# Altium footprint library 1.08-LED发光二极管.PcbLib: 72 footprints (part 4 of 5)
Each footprint in its own frame and in the unit in brackets; x right, y up, seen from the top. Pads: shape width x height; smd on the part's side, far side on the other; paste and mask are expansions set on the pad; w line width, h text height; cw(c..) or ccw(c..) is an arc to the next point about the centre after c.
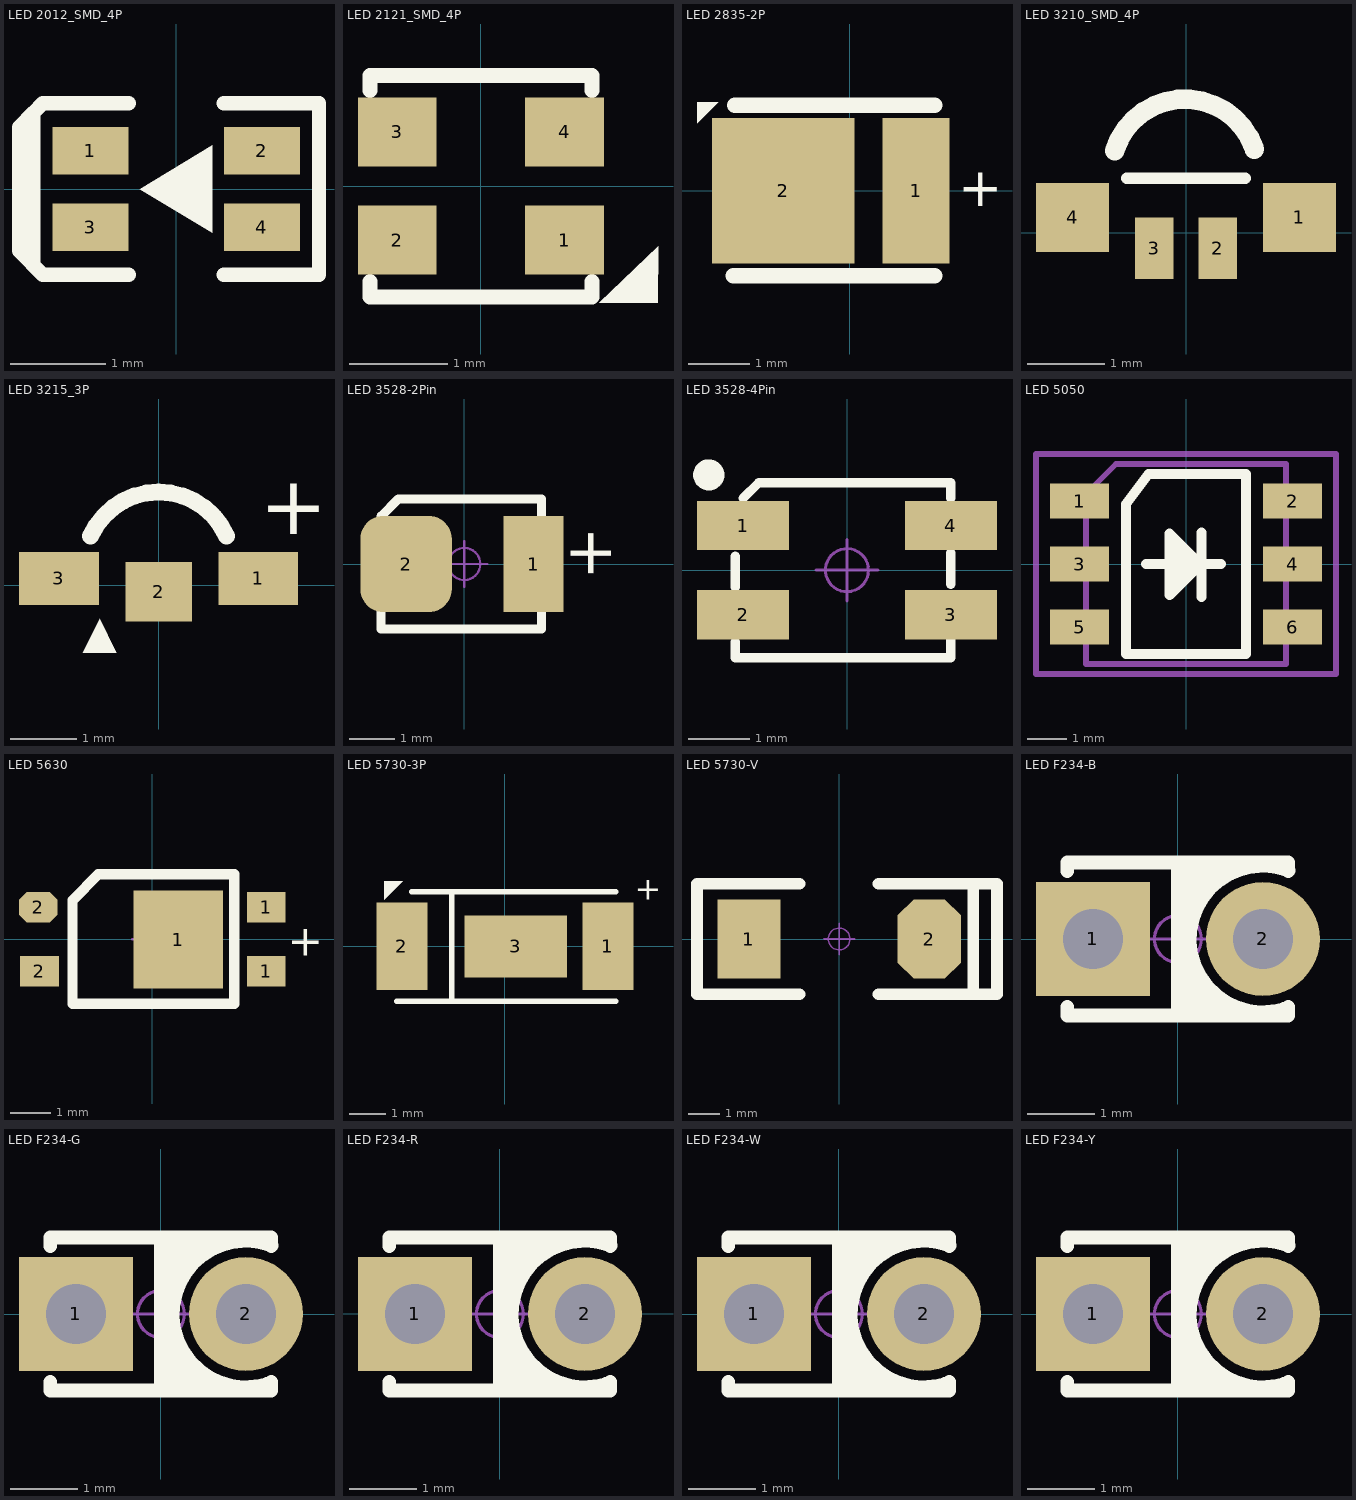
[diagram p3: the footprints below, top view; thin cyan lines are the x and y axes]

## LED 2012_SMD_4P [mm] "封装来自淘宝卖家ID:黄晶宝石"
pads (4):
  rect 0.8x0.5 smd: 1(-0.9,0.4) 2(0.9,0.4) 3(-0.9,-0.4) 4(0.9,-0.4)
Top Overlay:
  region: 0.381,0.457 0.381,-0.457 -0.381,0
  lines w0.152: -0.5,-0.9 -1.4,-0.899 ; -0.5,0.9 -1.4,0.899 -1.499,0.8 ; 0.5,-0.899 1.501,-0.899 1.501,0.899 0.5,0.899 ; -1.499,0.8 -1.5,0.8 -1.651,0.649 -1.651,-0.648 -1.4,-0.899 ; -1.499,0.8 -1.499,-0.8 -1.4,-0.899
3D body: height 0.51, standoff 0, extent -1,-0.6 1,0.6

## LED 2121_SMD_4P [mm] "封装来自淘宝卖家ID:黄晶宝石"
pads (4):
  rect 0.8x0.7 smd: 1(0.85,-0.55) 2(-0.85,-0.55) 3(-0.85,0.55) 4(0.85,0.55)
Top Overlay:
  region: 1.799,-0.614 1.799,-1.186 1.201,-1.186
  lines w0.152: -1.126,-0.971 -1.126,-1.126 1.126,-1.126 1.126,-0.971 ; -1.126,0.97 -1.126,1.126 1.126,1.126 1.126,0.97
3D body: height 0.51, standoff 0, extent -1,-1 1,1

## LED 2835-2P [mm]
pads (2):
  rect 1.1x2.38 smd mask+0.051: 1(1.088,0)
  rect 2.33x2.38 smd mask+0.051: 2(-1.088,0)
Top Overlay:
  region: -2.5,1.1 -2.5,1.45 -2.15,1.45
  lines w0.254: -1.905,-1.397 1.397,-1.397 ; -1.885,1.397 1.397,1.397
  text "+" at 1.778,-0.254 h0.64
3D body: height 0.71, standoff 0, extent -2.064,-1.4 1.536,1.4

## LED 3210_SMD_4P [mm] "封装来自淘宝卖家ID:黄晶宝石"
pads (4):
  rect 0.95x0.9 smd: 1(1.475,0.2) 4(-1.475,0.2)
  rect 0.5x0.8 smd: 2(0.415,-0.2) 3(-0.415,-0.2)
Top Overlay:
  lines w0.152: -0.769,0.708 0.769,0.708
  lines w0.254: -0.927,1.065 cw(c-0.015,0.783) 0.889,1.089
3D body: height 0.51, standoff 0, extent -1.5,-0.3 1.5,0.7

## LED 3215_3P [mm] "联系卖家 免费查找封装"
pads (3):
  rect 1.2x0.8 smd mask+0.051: 1(1.5,0.1) 3(-1.5,0.1)
  rect 1x0.9 smd mask+0.051: 2(0,-0.1)
Top Overlay:
  region: -0.889,-0.508 -1.143,-1.016 -0.635,-1.016
  lines w0.254: -1.022,0.739 cw(c0,0.281) 1.022,0.739
  text "+" at 1.524,0.762 h0.89
3D body: height 0.9, standoff 0.1, extent -1,0.358 1,1.357
3D body: height 1, standoff 0, extent -1.6,-0.142 1.6,0.358

## LED 3528-2Pin [mm] "2脚，3528LED"
pads (2):
  rect 1.3x2.1 smd: 1(1.511,0)
  rrect50% 2x2.1 smd: 2(-1.27,0)
Top Overlay:
  lines w0.2: -1.816,-1.422 -1.816,1.041 -1.435,1.422 1.689,1.422 1.689,-1.422 -1.816,-1.422
  text "+" at 3.213,-0.356 h1.02
Mechanical 15:
  circle w0.05: c0,0 r0.35
  lines w0.05: -0.5,0 0.5,0 ; 0,-0.5 0,0.5
3D body: height 1.95, standoff 0.05, extent -1.75,-1.4 1.75,1.4

## LED 3528-4Pin [mm] "4脚，3528LED"
pads (4):
  rect 1.5x0.8 smd: 1(-1.689,0.725) 2(-1.689,-0.725) 3(1.689,-0.725) 4(1.689,0.725)
Top Overlay:
  circle w0.254: c-2.248,1.549 r0.127
  lines w0.152: -1.816,-1.168 -1.816,-1.422 1.689,-1.422 1.689,-1.118 ; -1.816,-0.279 -1.816,0.229 ; -1.689,1.168 -1.435,1.422 1.689,1.422 1.689,1.168 ; 1.689,-0.229 1.689,0.279
Mechanical 15:
  circle w0.05: c0,0 r0.35
  lines w0.05: -0.5,0 0.5,0 ; 0,-0.5 0,0.5
3D body: height 1.95, standoff 0.05, extent -1.75,-1.4 1.75,1.4

## LED 5050 [mm] "白色5050LED                           淘宝卖家ID:黄晶宝石"
pads (6):
  rect 1.5x0.9 smd: 1(-2.705,1.6) 2(2.705,1.6) 3(-2.705,0) 4(2.705,0) 5(-2.705,-1.6) 6(2.705,-1.6)
Top Overlay:
  lines w0.254: -1.016,0 0.889,0 ; -0.254,0.559 -0.229,-0.432 0.254,0 0,0.254 0,0 0,-0.254 ; 0.356,-0.02 -0.417,-0.792 -0.417,0.775 0.396,-0.038 ; 0.396,-0.841 0.396,0.805 ; -1.524,-2.286 1.524,-2.286 1.524,2.286 -0.953,2.286 -1.524,1.524 -1.524,-2.286
Mechanical 13:
  lines w0.15: -2.54,-2.54 2.54,-2.54 2.54,2.54 -1.778,2.54 -2.54,1.778 -2.54,-2.54
Mechanical 15:
  circle w0.05: c0,0 r0.35
  lines w0.05: -0.5,0 0.5,0 ; 0,-0.5 0,0.5
  lines w0.15: -3.81,-2.794 3.81,-2.794 3.81,2.794 -3.81,2.794 -3.81,-2.794
3D body: height 1.65, standoff 0.77, extent -1.995,-1.995 1.995,1.995
3D body: height 1.65, standoff 0.05, extent -2.7,-2.5 2.7,2.5

## LED 5630 [mm] "白色5630LED                 联系卖家 免费查找封装"
pads (5):
  rect 2.2x2.4 smd: 1(0.635,-0.006)
  rect 0.95x0.75 smd: 1(2.794,-0.781) 1(2.794,0.781) 2(-2.769,-0.781)
  oct 0.95x0.75 smd: 2(-2.794,0.781)
Top Overlay:
  lines w0.254: -1.956,-1.581 -1.956,0.959 -1.321,1.594 2.007,1.594 2.007,-1.581 -1.956,-1.581
  text "+" at 3.327,-0.4 h0.76
Mechanical 15:
  circle w0.05: c0,0 r0.35
  lines w0.05: -0.5,0 0.5,0 ; 0,-0.5 0,0.5
3D body: height 0.95, standoff 0.6, extent -2.395,-1.395 2.395,1.395
3D body: height 0.95, standoff 0.05, extent -2.9,-1.5 2.9,1.5

## LED 5730-3P [mm]
pads (3):
  rect 1.4x2.4 smd mask+0.051: 1(2.82,0) 2(-2.82,0)
  rect 2.8x1.7 smd mask+0.051: 3(0.3,0)
Top Overlay:
  region: -3.302,1.778 -3.302,1.27 -2.794,1.778
  lines w0.15: -2.962,-1.501 3.041,-1.501 ; -2.55,1.501 3.041,1.501 ; -1.46,-1.501 -1.46,1.501
  text "+" at 3.556,1.27 h0.64
3D body: height 0.81, standoff 0, extent -2.55,-1.5 3.15,1.5

## LED 5730-V [mm] "紫色5730LED                           淘宝卖家ID:黄晶宝石"
pads (2):
  rect 2.032x2.54 smd: 1(-2.9,0)
  oct 2.032x2.54 smd: 2(2.9,0)
Top Overlay:
  lines w0.381: -1.27,-1.778 -4.572,-1.778 -4.572,1.778 -1.27,1.778 ; 1.27,-1.778 4.318,-1.778 ; 1.27,1.778 4.318,1.778 4.318,-1.778 ; 4.191,1.778 5.08,1.778 5.08,-1.778 4.318,-1.778
Mechanical 15:
  circle w0.05: c0,0 r0.35
  lines w0.05: -0.5,0 0.5,0 ; 0,-0.5 0,0.5
3D body: height 0.85, standoff 0, extent -2.85,-1.5 2.85,1.5

## LED F234-B [mm] "蓝色2mm*3mm*4mm(长*宽*高)        黄晶宝石"
pads (2):
  rect 1.7x1.7 hole 0.9: 1(-1.27,0)
  round 1.7 hole 0.9: 2(1.27,0)
Top Overlay:
  lines w0.203: -1.651,-1.016 -1.651,-1.143 1.651,-1.143 1.651,-1.016 ; -1.651,1.016 -1.651,1.143 1.651,1.143 1.651,1.016 ; 0,-1.143 0,1.143 ; 0,-0.889 0.254,-1.143 ; 0,-0.635 0.508,-1.143 ; 0,-0.381 0.762,-1.143 ; 0,0.381 0.762,1.143 ; 0,0.635 0.508,1.143 ; 0,0.889 0.254,1.143 ; 0.127,-0.635 0.127,0.508 ; 1.584,-1.046 cw(c1.27,0) 1.654,1.023
Mechanical 15:
  circle w0.05: c0,0 r0.35
  lines w0.05: -0.5,0 0.5,0 ; 0,-0.5 0,0.5
3D body: height 4.05, standoff 0.05, extent -1.5,-1 1.5,1
3D body: height 3.01, standoff -3.45, extent -1.52,-0.838 1.52,0.838

## LED F234-G [mm] "绿色2mm*3mm*4mm(长*宽*高)       黄晶宝石"
pads (2):
  rect 1.7x1.7 hole 0.9: 1(-1.27,0)
  round 1.7 hole 0.9: 2(1.27,0)
Top Overlay:
  lines w0.203: -1.651,-1.016 -1.651,-1.143 1.651,-1.143 1.651,-1.016 ; -1.651,1.016 -1.651,1.143 1.651,1.143 1.651,1.016 ; 0,-1.143 0,1.143 ; 0,-0.889 0.254,-1.143 ; 0,-0.635 0.508,-1.143 ; 0,-0.381 0.762,-1.143 ; 0,0.381 0.762,1.143 ; 0,0.635 0.508,1.143 ; 0,0.889 0.254,1.143 ; 0.127,-0.635 0.127,0.508 ; 1.584,-1.046 cw(c1.27,0) 1.654,1.023
Mechanical 15:
  circle w0.05: c0,0 r0.35
  lines w0.05: -0.5,0 0.5,0 ; 0,-0.5 0,0.5
3D body: height 3.01, standoff -3.45, extent -1.52,-0.838 1.52,0.838
3D body: height 4.05, standoff 0.05, extent -1.5,-1 1.5,1

## LED F234-R [mm] "红色2mm*3mm*4mm(长*宽*高)"
pads (2):
  rect 1.7x1.7 hole 0.9: 1(-1.27,0)
  round 1.7 hole 0.9: 2(1.27,0)
Top Overlay:
  lines w0.203: -1.651,-1.016 -1.651,-1.143 1.651,-1.143 1.651,-1.016 ; -1.651,1.016 -1.651,1.143 1.651,1.143 1.651,1.016 ; 0,-1.143 0,1.143 ; 0,-0.889 0.254,-1.143 ; 0,-0.635 0.508,-1.143 ; 0,-0.381 0.762,-1.143 ; 0,0.381 0.762,1.143 ; 0,0.635 0.508,1.143 ; 0,0.889 0.254,1.143 ; 0.127,-0.635 0.127,0.508 ; 1.584,-1.047 cw(c1.27,0) 1.654,1.023
Mechanical 15:
  circle w0.05: c0,0 r0.35
  lines w0.05: -0.5,0 0.5,0 ; 0,-0.5 0,0.5
3D body: height 3.01, standoff -3.45, extent -1.52,-0.838 1.52,0.838
3D body: height 4.05, standoff 0.05, extent -1.5,-1 1.5,1
3D body: height 0, standoff 0, extent 0,0 0,0

## LED F234-W [mm] "透明色2mm*3mm*4mm(长*宽*高)"
pads (2):
  rect 1.7x1.7 hole 0.9: 1(-1.27,0)
  round 1.7 hole 0.9: 2(1.27,0)
Top Overlay:
  lines w0.203: -1.651,-1.016 -1.651,-1.143 1.651,-1.143 1.651,-1.016 ; -1.651,1.016 -1.651,1.143 1.651,1.143 1.651,1.016 ; 0,-1.143 0,1.143 ; 0,-0.889 0.254,-1.143 ; 0,-0.635 0.508,-1.143 ; 0,-0.381 0.762,-1.143 ; 0,0.381 0.762,1.143 ; 0,0.635 0.508,1.143 ; 0,0.889 0.254,1.143 ; 0.127,-0.635 0.127,0.508 ; 1.584,-1.046 cw(c1.27,0) 1.654,1.023
Mechanical 15:
  circle w0.05: c0,0 r0.35
  lines w0.05: -0.5,0 0.5,0 ; 0,-0.5 0,0.5
3D body: height 2.94, standoff -3.52, extent -1.52,-0.838 1.52,0.838
3D body: height 4.05, standoff 0.05, extent -1.5,-1 1.5,1

## LED F234-Y [mm] "黄色2mm*3mm*4mm(长*宽*高)"
pads (2):
  rect 1.7x1.7 hole 0.9: 1(-1.27,0)
  round 1.7 hole 0.9: 2(1.27,0)
Top Overlay:
  lines w0.203: -1.651,-1.016 -1.651,-1.143 1.651,-1.143 1.651,-1.016 ; -1.651,1.016 -1.651,1.143 1.651,1.143 1.651,1.016 ; 0,-1.143 0,1.143 ; 0,-0.889 0.254,-1.143 ; 0,-0.635 0.508,-1.143 ; 0,-0.381 0.762,-1.143 ; 0,0.381 0.762,1.143 ; 0,0.635 0.508,1.143 ; 0,0.889 0.254,1.143 ; 0.127,-0.635 0.127,0.508 ; 1.584,-1.046 cw(c1.27,0) 1.654,1.023
Mechanical 15:
  circle w0.05: c0,0 r0.35
  lines w0.05: -0.5,0 0.5,0 ; 0,-0.5 0,0.5
3D body: height 4.05, standoff 0.05, extent -1.5,-1 1.5,1
3D body: height 2.94, standoff -3.52, extent -1.52,-0.838 1.52,0.838